# Altium footprint library Connector_PinHeader_2.00mm.PcbLib: 278 footprints (part 8 of 18)
Each footprint in its own frame and in the unit in brackets; x right, y up, seen from the top. Pads: shape width x height; smd on the part's side, far side on the other; paste and mask are expansions set on the pad; w line width, h text height; cw(c..) or ccw(c..) is an arc to the next point about the centre after c.
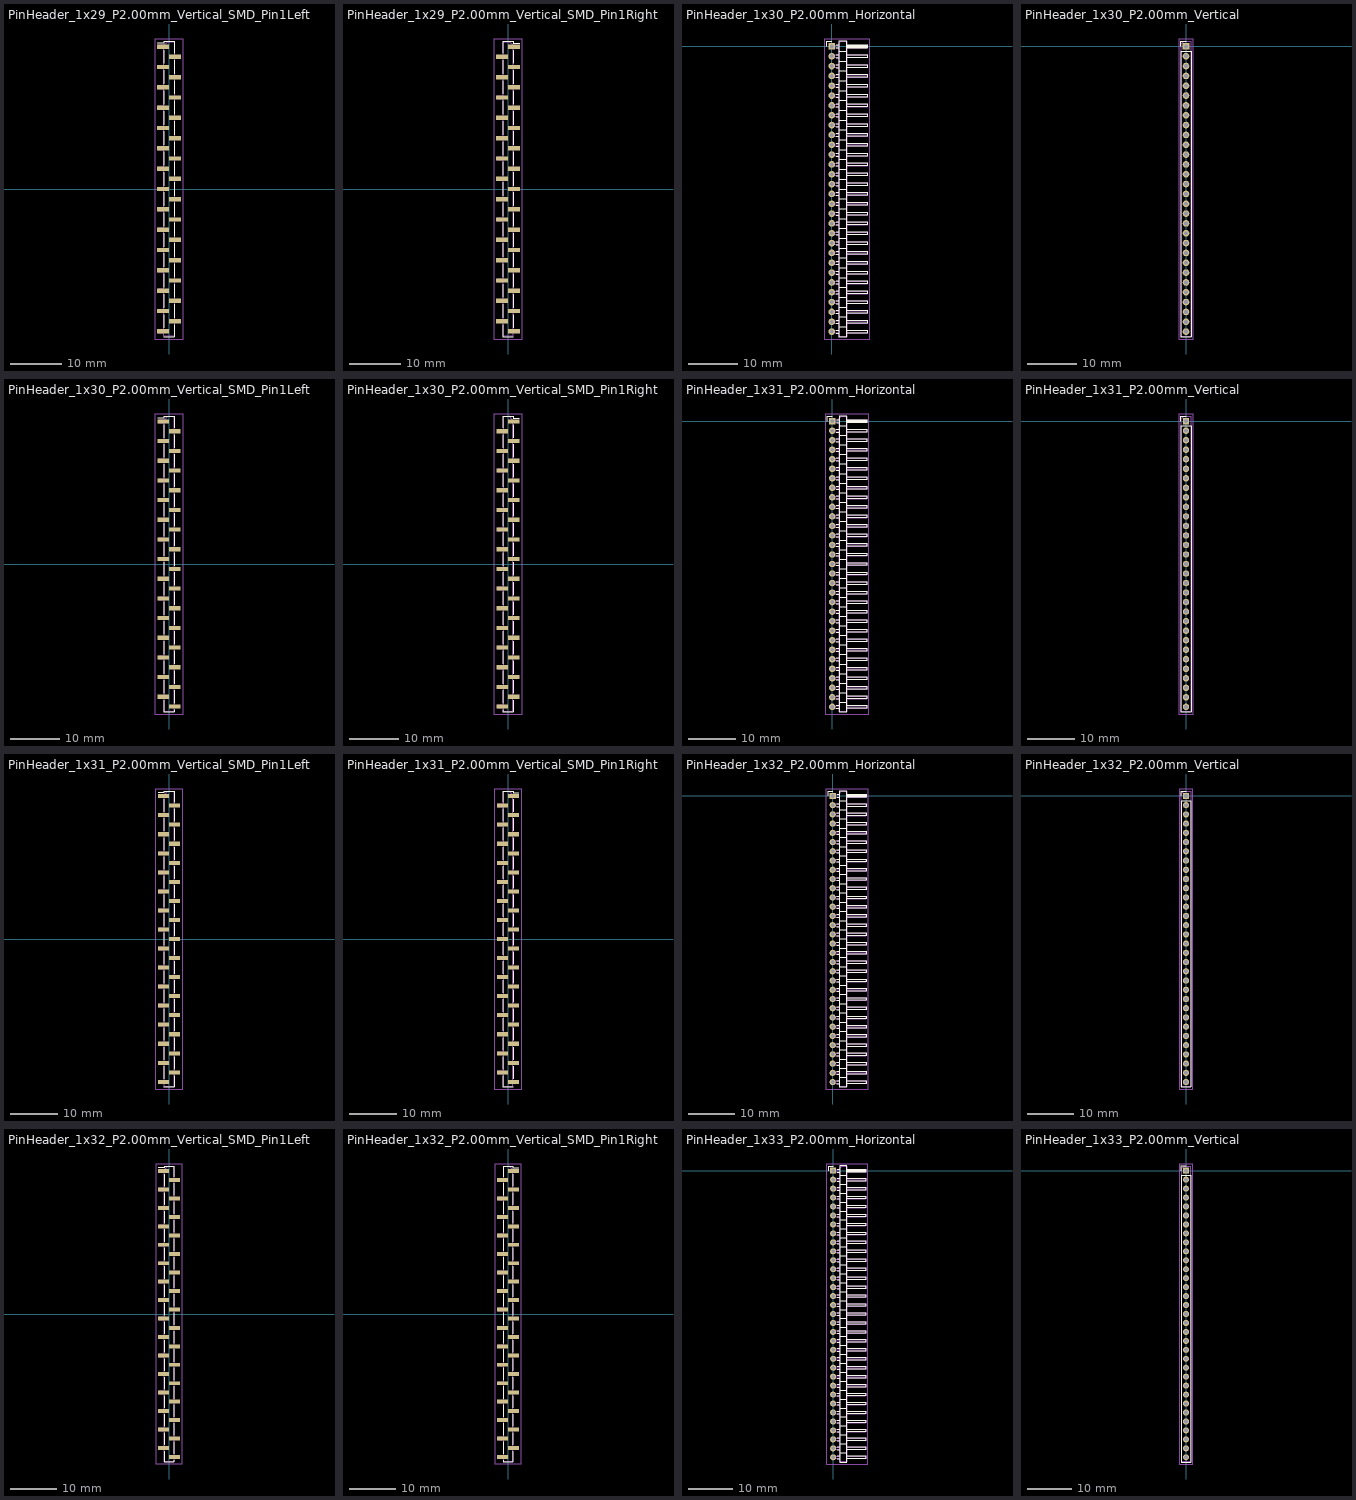
[diagram p7: the footprints below, top view; thin cyan lines are the x and y axes]

## PinHeader_1x29_P2.00mm_Vertical_SMD_Pin1Left [mm]
pads (29):
  rect 2.35x0.85 smd: 1(-1.175,28) 2(1.175,26) 3(-1.175,24) 4(1.175,22) 5(-1.175,20) 6(1.175,18) 7(-1.175,16) 8(1.175,14) 9(-1.175,12) 10(1.175,10) 11(-1.175,8) 12(1.175,6) 13(-1.175,4) 14(1.175,2) 15(-1.175,0) 16(1.175,-2) 17(-1.175,-4) 18(1.175,-6) 19(-1.175,-8) 20(1.175,-10) 21(-1.175,-12) 22(1.175,-14) 23(-1.175,-16) 24(1.175,-18) 25(-1.175,-20) 26(1.175,-22) 27(-1.175,-24) 28(1.175,-26) 29(-1.175,-28)
F.SilkS:
  lines w0.12: -2.29,28.685 -1.06,28.685 -1.06,29.06 1.06,29.06 1.06,26.685 ; -1.06,-29.06 1.06,-29.06 ; -1.06,-27.315 -1.06,-24.685 ; -1.06,-23.315 -1.06,-20.685 ; -1.06,-19.315 -1.06,-16.685 ; -1.06,-15.315 -1.06,-12.685 ; -1.06,-11.315 -1.06,-8.685 ; -1.06,-7.315 -1.06,-4.685 ; -1.06,-3.315 -1.06,-0.685 ; -1.06,0.685 -1.06,3.315 ; -1.06,4.685 -1.06,7.315 ; -1.06,8.685 -1.06,11.315 ; -1.06,12.685 -1.06,15.315 ; -1.06,16.685 -1.06,19.315 ; -1.06,20.685 -1.06,23.315 ; -1.06,24.685 -1.06,27.315 ; 1.06,-28.685 1.06,-29.06 ; 1.06,-26.685 1.06,-29.06 ; 1.06,-25.315 1.06,-22.685 ; 1.06,-21.315 1.06,-18.685 ; 1.06,-17.315 1.06,-14.685 ; 1.06,-13.315 1.06,-10.685 ; 1.06,-9.315 1.06,-6.685 ; 1.06,-5.315 1.06,-2.685 ; 1.06,-1.315 1.06,1.315 ; 1.06,2.685 1.06,5.315 ; 1.06,6.685 1.06,9.315 ; 1.06,10.685 1.06,13.315 ; 1.06,14.685 1.06,17.315 ; 1.06,18.685 1.06,21.315 ; 1.06,22.685 1.06,25.315
F.CrtYd:
  lines w0.05: -2.85,-29.5 2.85,-29.5 2.85,29.5 -2.85,29.5 -2.85,-29.5
F.Fab:
  lines w0.1: -1,-28.25 -2.1,-28.25 -2.1,-27.75 -1,-27.75 ; -1,-24.25 -2.1,-24.25 -2.1,-23.75 -1,-23.75 ; -1,-20.25 -2.1,-20.25 -2.1,-19.75 -1,-19.75 ; -1,-16.25 -2.1,-16.25 -2.1,-15.75 -1,-15.75 ; -1,-12.25 -2.1,-12.25 -2.1,-11.75 -1,-11.75 ; -1,-8.25 -2.1,-8.25 -2.1,-7.75 -1,-7.75 ; -1,-4.25 -2.1,-4.25 -2.1,-3.75 -1,-3.75 ; -1,-0.25 -2.1,-0.25 -2.1,0.25 -1,0.25 ; -1,3.75 -2.1,3.75 -2.1,4.25 -1,4.25 ; -1,7.75 -2.1,7.75 -2.1,8.25 -1,8.25 ; -1,11.75 -2.1,11.75 -2.1,12.25 -1,12.25 ; -1,15.75 -2.1,15.75 -2.1,16.25 -1,16.25 ; -1,19.75 -2.1,19.75 -2.1,20.25 -1,20.25 ; -1,23.75 -2.1,23.75 -2.1,24.25 -1,24.25 ; -1,27.75 -2.1,27.75 -2.1,28.25 -1,28.25 ; 1,-26.25 2.1,-26.25 2.1,-25.75 1,-25.75 ; 1,-22.25 2.1,-22.25 2.1,-21.75 1,-21.75 ; 1,-18.25 2.1,-18.25 2.1,-17.75 1,-17.75 ; 1,-14.25 2.1,-14.25 2.1,-13.75 1,-13.75 ; 1,-10.25 2.1,-10.25 2.1,-9.75 1,-9.75 ; 1,-6.25 2.1,-6.25 2.1,-5.75 1,-5.75 ; 1,-2.25 2.1,-2.25 2.1,-1.75 1,-1.75 ; 1,1.75 2.1,1.75 2.1,2.25 1,2.25 ; 1,5.75 2.1,5.75 2.1,6.25 1,6.25 ; 1,9.75 2.1,9.75 2.1,10.25 1,10.25 ; 1,13.75 2.1,13.75 2.1,14.25 1,14.25 ; 1,17.75 2.1,17.75 2.1,18.25 1,18.25 ; 1,21.75 2.1,21.75 2.1,22.25 1,22.25 ; 1,25.75 2.1,25.75 2.1,26.25 1,26.25 ; -1,28.25 -0.25,29 1,29 1,-29 -1,-29 -1,28.25
  text "'.Designator'" at 0.84,-4.047 h1

## PinHeader_1x29_P2.00mm_Vertical_SMD_Pin1Right [mm]
pads (29):
  rect 2.35x0.85 smd: 1(1.175,28) 2(-1.175,26) 3(1.175,24) 4(-1.175,22) 5(1.175,20) 6(-1.175,18) 7(1.175,16) 8(-1.175,14) 9(1.175,12) 10(-1.175,10) 11(1.175,8) 12(-1.175,6) 13(1.175,4) 14(-1.175,2) 15(1.175,0) 16(-1.175,-2) 17(1.175,-4) 18(-1.175,-6) 19(1.175,-8) 20(-1.175,-10) 21(1.175,-12) 22(-1.175,-14) 23(1.175,-16) 24(-1.175,-18) 25(1.175,-20) 26(-1.175,-22) 27(1.175,-24) 28(-1.175,-26) 29(1.175,-28)
F.SilkS:
  lines w0.12: -1.06,-28.685 -1.06,-29.06 ; -1.06,-26.685 -1.06,-29.06 ; -1.06,-25.315 -1.06,-22.685 ; -1.06,-21.315 -1.06,-18.685 ; -1.06,-17.315 -1.06,-14.685 ; -1.06,-13.315 -1.06,-10.685 ; -1.06,-9.315 -1.06,-6.685 ; -1.06,-5.315 -1.06,-2.685 ; -1.06,-1.315 -1.06,1.315 ; -1.06,2.685 -1.06,5.315 ; -1.06,6.685 -1.06,9.315 ; -1.06,10.685 -1.06,13.315 ; -1.06,14.685 -1.06,17.315 ; -1.06,18.685 -1.06,21.315 ; -1.06,22.685 -1.06,25.315 ; -1.06,26.685 -1.06,29.06 1.06,29.06 1.06,28.685 2.29,28.685 ; 1.06,-29.06 -1.06,-29.06 ; 1.06,-27.315 1.06,-24.685 ; 1.06,-23.315 1.06,-20.685 ; 1.06,-19.315 1.06,-16.685 ; 1.06,-15.315 1.06,-12.685 ; 1.06,-11.315 1.06,-8.685 ; 1.06,-7.315 1.06,-4.685 ; 1.06,-3.315 1.06,-0.685 ; 1.06,0.685 1.06,3.315 ; 1.06,4.685 1.06,7.315 ; 1.06,8.685 1.06,11.315 ; 1.06,12.685 1.06,15.315 ; 1.06,16.685 1.06,19.315 ; 1.06,20.685 1.06,23.315 ; 1.06,24.685 1.06,27.315
F.CrtYd:
  lines w0.05: -2.85,-29.5 -2.85,29.5 2.85,29.5 2.85,-29.5 -2.85,-29.5
F.Fab:
  lines w0.1: -1,-26.25 -2.1,-26.25 -2.1,-25.75 -1,-25.75 ; -1,-22.25 -2.1,-22.25 -2.1,-21.75 -1,-21.75 ; -1,-18.25 -2.1,-18.25 -2.1,-17.75 -1,-17.75 ; -1,-14.25 -2.1,-14.25 -2.1,-13.75 -1,-13.75 ; -1,-10.25 -2.1,-10.25 -2.1,-9.75 -1,-9.75 ; -1,-6.25 -2.1,-6.25 -2.1,-5.75 -1,-5.75 ; -1,-2.25 -2.1,-2.25 -2.1,-1.75 -1,-1.75 ; -1,1.75 -2.1,1.75 -2.1,2.25 -1,2.25 ; -1,5.75 -2.1,5.75 -2.1,6.25 -1,6.25 ; -1,9.75 -2.1,9.75 -2.1,10.25 -1,10.25 ; -1,13.75 -2.1,13.75 -2.1,14.25 -1,14.25 ; -1,17.75 -2.1,17.75 -2.1,18.25 -1,18.25 ; -1,21.75 -2.1,21.75 -2.1,22.25 -1,22.25 ; -1,25.75 -2.1,25.75 -2.1,26.25 -1,26.25 ; 1,-28.25 2.1,-28.25 2.1,-27.75 1,-27.75 ; 1,-24.25 2.1,-24.25 2.1,-23.75 1,-23.75 ; 1,-20.25 2.1,-20.25 2.1,-19.75 1,-19.75 ; 1,-16.25 2.1,-16.25 2.1,-15.75 1,-15.75 ; 1,-12.25 2.1,-12.25 2.1,-11.75 1,-11.75 ; 1,-8.25 2.1,-8.25 2.1,-7.75 1,-7.75 ; 1,-4.25 2.1,-4.25 2.1,-3.75 1,-3.75 ; 1,-0.25 2.1,-0.25 2.1,0.25 1,0.25 ; 1,3.75 2.1,3.75 2.1,4.25 1,4.25 ; 1,7.75 2.1,7.75 2.1,8.25 1,8.25 ; 1,11.75 2.1,11.75 2.1,12.25 1,12.25 ; 1,15.75 2.1,15.75 2.1,16.25 1,16.25 ; 1,19.75 2.1,19.75 2.1,20.25 1,20.25 ; 1,23.75 2.1,23.75 2.1,24.25 1,24.25 ; 1,27.75 2.1,27.75 2.1,28.25 1,28.25 ; 1,28.25 0.25,29 -1,29 -1,-29 1,-29 1,28.25
  text "'.Designator'" at 0.84,-4.047 h1

## PinHeader_1x30_P2.00mm_Horizontal [mm]
pads (30):
  rect 1.35x1.35 hole 0.8: 1(0,0)
  rrect100% 1.35x1.35 hole 0.8: 2(0,-2) 3(0,-4) 4(0,-6) 5(0,-8) 6(0,-10) 7(0,-12) 8(0,-14) 9(0,-16) 10(0,-18) 11(0,-20) 12(0,-22) 13(0,-24) 14(0,-26) 15(0,-28) 16(0,-30) 17(0,-32) 18(0,-34) 19(0,-36) 20(0,-38) 21(0,-40) 22(0,-42) 23(0,-44) 24(0,-46) 25(0,-48) 26(0,-50) 27(0,-52) 28(0,-54) 29(0,-56) 30(0,-58)
F.SilkS:
  drawing of 190 lines, arcs and shapes, not listed
F.CrtYd:
  lines w0.05: -1.5,-59.5 7.7,-59.5 7.7,1.5 -1.5,1.5 -1.5,-59.5
F.Fab:
  drawing of 185 lines, arcs and shapes, not listed
  text "'.Designator'" at 3.006,-32.642 h0.9

## PinHeader_1x30_P2.00mm_Vertical [mm]
pads (30):
  rect 1.35x1.35 hole 0.8: 1(0,0)
  rrect100% 1.35x1.35 hole 0.8: 2(0,-2) 3(0,-4) 4(0,-6) 5(0,-8) 6(0,-10) 7(0,-12) 8(0,-14) 9(0,-16) 10(0,-18) 11(0,-20) 12(0,-22) 13(0,-24) 14(0,-26) 15(0,-28) 16(0,-30) 17(0,-32) 18(0,-34) 19(0,-36) 20(0,-38) 21(0,-40) 22(0,-42) 23(0,-44) 24(0,-46) 25(0,-48) 26(0,-50) 27(0,-52) 28(0,-54) 29(0,-56) 30(0,-58)
F.SilkS:
  lines w0.12: -1.06,0 -1.06,1.06 0,1.06 ; -1.06,-59.06 1.06,-59.06 1.06,-1 -1.06,-1 -1.06,-59.06
F.CrtYd:
  lines w0.05: -1.5,-59.5 1.5,-59.5 1.5,1.5 -1.5,1.5 -1.5,-59.5
F.Fab:
  lines w0.1: -1,-59 1,-59 1,1 -0.5,1 -1,0.5 -1,-59
  text "'.Designator'" at 0.84,-33.047 h1

## PinHeader_1x30_P2.00mm_Vertical_SMD_Pin1Left [mm]
pads (30):
  rect 2.35x0.85 smd: 1(-1.175,29) 2(1.175,27) 3(-1.175,25) 4(1.175,23) 5(-1.175,21) 6(1.175,19) 7(-1.175,17) 8(1.175,15) 9(-1.175,13) 10(1.175,11) 11(-1.175,9) 12(1.175,7) 13(-1.175,5) 14(1.175,3) 15(-1.175,1) 16(1.175,-1) 17(-1.175,-3) 18(1.175,-5) 19(-1.175,-7) 20(1.175,-9) 21(-1.175,-11) 22(1.175,-13) 23(-1.175,-15) 24(1.175,-17) 25(-1.175,-19) 26(1.175,-21) 27(-1.175,-23) 28(1.175,-25) 29(-1.175,-27) 30(1.175,-29)
F.SilkS:
  lines w0.12: -2.29,29.685 -1.06,29.685 -1.06,30.06 1.06,30.06 1.06,27.685 ; -1.06,-27.685 -1.06,-30.06 1.06,-30.06 1.06,-29.685 ; -1.06,-26.315 -1.06,-23.685 ; -1.06,-22.315 -1.06,-19.685 ; -1.06,-18.315 -1.06,-15.685 ; -1.06,-14.315 -1.06,-11.685 ; -1.06,-10.315 -1.06,-7.685 ; -1.06,-6.315 -1.06,-3.685 ; -1.06,-2.315 -1.06,0.315 ; -1.06,1.685 -1.06,4.315 ; -1.06,5.685 -1.06,8.315 ; -1.06,9.685 -1.06,12.315 ; -1.06,13.685 -1.06,16.315 ; -1.06,17.685 -1.06,20.315 ; -1.06,21.685 -1.06,24.315 ; -1.06,25.685 -1.06,28.315 ; 1.06,-28.315 1.06,-25.685 ; 1.06,-24.315 1.06,-21.685 ; 1.06,-20.315 1.06,-17.685 ; 1.06,-16.315 1.06,-13.685 ; 1.06,-12.315 1.06,-9.685 ; 1.06,-8.315 1.06,-5.685 ; 1.06,-4.315 1.06,-1.685 ; 1.06,-0.315 1.06,2.315 ; 1.06,3.685 1.06,6.315 ; 1.06,7.685 1.06,10.315 ; 1.06,11.685 1.06,14.315 ; 1.06,15.685 1.06,18.315 ; 1.06,19.685 1.06,22.315 ; 1.06,23.685 1.06,26.315
F.CrtYd:
  lines w0.05: -2.85,-30.5 -2.85,30.5 2.85,30.5 2.85,-30.5 -2.85,-30.5
F.Fab:
  lines w0.1: -1,-27.25 -2.1,-27.25 -2.1,-26.75 -1,-26.75 ; -1,-23.25 -2.1,-23.25 -2.1,-22.75 -1,-22.75 ; -1,-19.25 -2.1,-19.25 -2.1,-18.75 -1,-18.75 ; -1,-15.25 -2.1,-15.25 -2.1,-14.75 -1,-14.75 ; -1,-11.25 -2.1,-11.25 -2.1,-10.75 -1,-10.75 ; -1,-7.25 -2.1,-7.25 -2.1,-6.75 -1,-6.75 ; -1,-3.25 -2.1,-3.25 -2.1,-2.75 -1,-2.75 ; -1,0.75 -2.1,0.75 -2.1,1.25 -1,1.25 ; -1,4.75 -2.1,4.75 -2.1,5.25 -1,5.25 ; -1,8.75 -2.1,8.75 -2.1,9.25 -1,9.25 ; -1,12.75 -2.1,12.75 -2.1,13.25 -1,13.25 ; -1,16.75 -2.1,16.75 -2.1,17.25 -1,17.25 ; -1,20.75 -2.1,20.75 -2.1,21.25 -1,21.25 ; -1,24.75 -2.1,24.75 -2.1,25.25 -1,25.25 ; -1,28.75 -2.1,28.75 -2.1,29.25 -1,29.25 ; 1,-29.25 2.1,-29.25 2.1,-28.75 1,-28.75 ; 1,-25.25 2.1,-25.25 2.1,-24.75 1,-24.75 ; 1,-21.25 2.1,-21.25 2.1,-20.75 1,-20.75 ; 1,-17.25 2.1,-17.25 2.1,-16.75 1,-16.75 ; 1,-13.25 2.1,-13.25 2.1,-12.75 1,-12.75 ; 1,-9.25 2.1,-9.25 2.1,-8.75 1,-8.75 ; 1,-5.25 2.1,-5.25 2.1,-4.75 1,-4.75 ; 1,-1.25 2.1,-1.25 2.1,-0.75 1,-0.75 ; 1,2.75 2.1,2.75 2.1,3.25 1,3.25 ; 1,6.75 2.1,6.75 2.1,7.25 1,7.25 ; 1,10.75 2.1,10.75 2.1,11.25 1,11.25 ; 1,14.75 2.1,14.75 2.1,15.25 1,15.25 ; 1,18.75 2.1,18.75 2.1,19.25 1,19.25 ; 1,22.75 2.1,22.75 2.1,23.25 1,23.25 ; 1,26.75 2.1,26.75 2.1,27.25 1,27.25 ; -1,29.25 -0.25,30 1,30 1,-30 -1,-30 -1,29.25
  text "'.Designator'" at 0.84,-4.047 h1

## PinHeader_1x30_P2.00mm_Vertical_SMD_Pin1Right [mm]
pads (30):
  rect 2.35x0.85 smd: 1(1.175,29) 2(-1.175,27) 3(1.175,25) 4(-1.175,23) 5(1.175,21) 6(-1.175,19) 7(1.175,17) 8(-1.175,15) 9(1.175,13) 10(-1.175,11) 11(1.175,9) 12(-1.175,7) 13(1.175,5) 14(-1.175,3) 15(1.175,1) 16(-1.175,-1) 17(1.175,-3) 18(-1.175,-5) 19(1.175,-7) 20(-1.175,-9) 21(1.175,-11) 22(-1.175,-13) 23(1.175,-15) 24(-1.175,-17) 25(1.175,-19) 26(-1.175,-21) 27(1.175,-23) 28(-1.175,-25) 29(1.175,-27) 30(-1.175,-29)
F.SilkS:
  lines w0.12: -1.06,-29.685 -1.06,-30.06 1.06,-30.06 1.06,-27.685 ; -1.06,-28.315 -1.06,-25.685 ; -1.06,-24.315 -1.06,-21.685 ; -1.06,-20.315 -1.06,-17.685 ; -1.06,-16.315 -1.06,-13.685 ; -1.06,-12.315 -1.06,-9.685 ; -1.06,-8.315 -1.06,-5.685 ; -1.06,-4.315 -1.06,-1.685 ; -1.06,-0.315 -1.06,2.315 ; -1.06,3.685 -1.06,6.315 ; -1.06,7.685 -1.06,10.315 ; -1.06,11.685 -1.06,14.315 ; -1.06,15.685 -1.06,18.315 ; -1.06,19.685 -1.06,22.315 ; -1.06,23.685 -1.06,26.315 ; -1.06,27.685 -1.06,30.06 1.06,30.06 1.06,29.685 2.29,29.685 ; 1.06,-26.315 1.06,-23.685 ; 1.06,-22.315 1.06,-19.685 ; 1.06,-18.315 1.06,-15.685 ; 1.06,-14.315 1.06,-11.685 ; 1.06,-10.315 1.06,-7.685 ; 1.06,-6.315 1.06,-3.685 ; 1.06,-2.315 1.06,0.315 ; 1.06,1.685 1.06,4.315 ; 1.06,5.685 1.06,8.315 ; 1.06,9.685 1.06,12.315 ; 1.06,13.685 1.06,16.315 ; 1.06,17.685 1.06,20.315 ; 1.06,21.685 1.06,24.315 ; 1.06,25.685 1.06,28.315
F.CrtYd:
  lines w0.05: -2.85,-30.5 -2.85,30.5 2.85,30.5 2.85,-30.5 -2.85,-30.5
F.Fab:
  lines w0.1: -1,-29.25 -2.1,-29.25 -2.1,-28.75 -1,-28.75 ; -1,-25.25 -2.1,-25.25 -2.1,-24.75 -1,-24.75 ; -1,-21.25 -2.1,-21.25 -2.1,-20.75 -1,-20.75 ; -1,-17.25 -2.1,-17.25 -2.1,-16.75 -1,-16.75 ; -1,-13.25 -2.1,-13.25 -2.1,-12.75 -1,-12.75 ; -1,-9.25 -2.1,-9.25 -2.1,-8.75 -1,-8.75 ; -1,-5.25 -2.1,-5.25 -2.1,-4.75 -1,-4.75 ; -1,-1.25 -2.1,-1.25 -2.1,-0.75 -1,-0.75 ; -1,2.75 -2.1,2.75 -2.1,3.25 -1,3.25 ; -1,6.75 -2.1,6.75 -2.1,7.25 -1,7.25 ; -1,10.75 -2.1,10.75 -2.1,11.25 -1,11.25 ; -1,14.75 -2.1,14.75 -2.1,15.25 -1,15.25 ; -1,18.75 -2.1,18.75 -2.1,19.25 -1,19.25 ; -1,22.75 -2.1,22.75 -2.1,23.25 -1,23.25 ; -1,26.75 -2.1,26.75 -2.1,27.25 -1,27.25 ; 1,-27.25 2.1,-27.25 2.1,-26.75 1,-26.75 ; 1,-23.25 2.1,-23.25 2.1,-22.75 1,-22.75 ; 1,-19.25 2.1,-19.25 2.1,-18.75 1,-18.75 ; 1,-15.25 2.1,-15.25 2.1,-14.75 1,-14.75 ; 1,-11.25 2.1,-11.25 2.1,-10.75 1,-10.75 ; 1,-7.25 2.1,-7.25 2.1,-6.75 1,-6.75 ; 1,-3.25 2.1,-3.25 2.1,-2.75 1,-2.75 ; 1,0.75 2.1,0.75 2.1,1.25 1,1.25 ; 1,4.75 2.1,4.75 2.1,5.25 1,5.25 ; 1,8.75 2.1,8.75 2.1,9.25 1,9.25 ; 1,12.75 2.1,12.75 2.1,13.25 1,13.25 ; 1,16.75 2.1,16.75 2.1,17.25 1,17.25 ; 1,20.75 2.1,20.75 2.1,21.25 1,21.25 ; 1,24.75 2.1,24.75 2.1,25.25 1,25.25 ; 1,28.75 2.1,28.75 2.1,29.25 1,29.25 ; 1,29.25 1,-30 -1,-30 -1,30 0.25,30 1,29.25
  text "'.Designator'" at 0.84,-4.047 h1

## PinHeader_1x31_P2.00mm_Horizontal [mm]
pads (31):
  rect 1.35x1.35 hole 0.8: 1(0,0)
  rrect100% 1.35x1.35 hole 0.8: 2(0,-2) 3(0,-4) 4(0,-6) 5(0,-8) 6(0,-10) 7(0,-12) 8(0,-14) 9(0,-16) 10(0,-18) 11(0,-20) 12(0,-22) 13(0,-24) 14(0,-26) 15(0,-28) 16(0,-30) 17(0,-32) 18(0,-34) 19(0,-36) 20(0,-38) 21(0,-40) 22(0,-42) 23(0,-44) 24(0,-46) 25(0,-48) 26(0,-50) 27(0,-52) 28(0,-54) 29(0,-56) 30(0,-58) 31(0,-60)
F.SilkS:
  drawing of 196 lines, arcs and shapes, not listed
F.CrtYd:
  lines w0.05: -1.5,-61.5 -1.5,1.5 7.7,1.5 7.7,-61.5 -1.5,-61.5
F.Fab:
  drawing of 191 lines, arcs and shapes, not listed
  text "'.Designator'" at 3.006,-33.642 h0.9

## PinHeader_1x31_P2.00mm_Vertical [mm]
pads (31):
  rect 1.35x1.35 hole 0.8: 1(0,0)
  rrect100% 1.35x1.35 hole 0.8: 2(0,-2) 3(0,-4) 4(0,-6) 5(0,-8) 6(0,-10) 7(0,-12) 8(0,-14) 9(0,-16) 10(0,-18) 11(0,-20) 12(0,-22) 13(0,-24) 14(0,-26) 15(0,-28) 16(0,-30) 17(0,-32) 18(0,-34) 19(0,-36) 20(0,-38) 21(0,-40) 22(0,-42) 23(0,-44) 24(0,-46) 25(0,-48) 26(0,-50) 27(0,-52) 28(0,-54) 29(0,-56) 30(0,-58) 31(0,-60)
F.SilkS:
  lines w0.12: -1.06,0 -1.06,1.06 0,1.06 ; -1.06,-61.06 -1.06,-1 1.06,-1 1.06,-61.06 -1.06,-61.06
F.CrtYd:
  lines w0.05: -1.5,-61.5 1.5,-61.5 1.5,1.5 -1.5,1.5 -1.5,-61.5
F.Fab:
  lines w0.1: -1,-61 -1,0.5 -0.5,1 1,1 1,-61 -1,-61
  text "'.Designator'" at 0.84,-34.047 h1

## PinHeader_1x31_P2.00mm_Vertical_SMD_Pin1Left [mm]
pads (31):
  rect 2.35x0.85 smd: 1(-1.175,30) 2(1.175,28) 3(-1.175,26) 4(1.175,24) 5(-1.175,22) 6(1.175,20) 7(-1.175,18) 8(1.175,16) 9(-1.175,14) 10(1.175,12) 11(-1.175,10) 12(1.175,8) 13(-1.175,6) 14(1.175,4) 15(-1.175,2) 16(1.175,0) 17(-1.175,-2) 18(1.175,-4) 19(-1.175,-6) 20(1.175,-8) 21(-1.175,-10) 22(1.175,-12) 23(-1.175,-14) 24(1.175,-16) 25(-1.175,-18) 26(1.175,-20) 27(-1.175,-22) 28(1.175,-24) 29(-1.175,-26) 30(1.175,-28) 31(-1.175,-30)
F.SilkS:
  lines w0.12: -2.29,30.685 -1.06,30.685 -1.06,31.06 1.06,31.06 1.06,28.685 ; -1.06,-31.06 1.06,-31.06 ; -1.06,-29.315 -1.06,-26.685 ; -1.06,-25.315 -1.06,-22.685 ; -1.06,-21.315 -1.06,-18.685 ; -1.06,-17.315 -1.06,-14.685 ; -1.06,-13.315 -1.06,-10.685 ; -1.06,-9.315 -1.06,-6.685 ; -1.06,-5.315 -1.06,-2.685 ; -1.06,-1.315 -1.06,1.315 ; -1.06,2.685 -1.06,5.315 ; -1.06,6.685 -1.06,9.315 ; -1.06,10.685 -1.06,13.315 ; -1.06,14.685 -1.06,17.315 ; -1.06,18.685 -1.06,21.315 ; -1.06,22.685 -1.06,25.315 ; -1.06,26.685 -1.06,29.315 ; 1.06,-30.685 1.06,-31.06 ; 1.06,-28.685 1.06,-31.06 ; 1.06,-27.315 1.06,-24.685 ; 1.06,-23.315 1.06,-20.685 ; 1.06,-19.315 1.06,-16.685 ; 1.06,-15.315 1.06,-12.685 ; 1.06,-11.315 1.06,-8.685 ; 1.06,-7.315 1.06,-4.685 ; 1.06,-3.315 1.06,-0.685 ; 1.06,0.685 1.06,3.315 ; 1.06,4.685 1.06,7.315 ; 1.06,8.685 1.06,11.315 ; 1.06,12.685 1.06,15.315 ; 1.06,16.685 1.06,19.315 ; 1.06,20.685 1.06,23.315 ; 1.06,24.685 1.06,27.315
F.CrtYd:
  lines w0.05: -2.85,-31.5 -2.85,31.5 2.85,31.5 2.85,-31.5 -2.85,-31.5
F.Fab:
  lines w0.1: -1,-30.25 -2.1,-30.25 -2.1,-29.75 -1,-29.75 ; -1,-26.25 -2.1,-26.25 -2.1,-25.75 -1,-25.75 ; -1,-22.25 -2.1,-22.25 -2.1,-21.75 -1,-21.75 ; -1,-18.25 -2.1,-18.25 -2.1,-17.75 -1,-17.75 ; -1,-14.25 -2.1,-14.25 -2.1,-13.75 -1,-13.75 ; -1,-10.25 -2.1,-10.25 -2.1,-9.75 -1,-9.75 ; -1,-6.25 -2.1,-6.25 -2.1,-5.75 -1,-5.75 ; -1,-2.25 -2.1,-2.25 -2.1,-1.75 -1,-1.75 ; -1,1.75 -2.1,1.75 -2.1,2.25 -1,2.25 ; -1,5.75 -2.1,5.75 -2.1,6.25 -1,6.25 ; -1,9.75 -2.1,9.75 -2.1,10.25 -1,10.25 ; -1,13.75 -2.1,13.75 -2.1,14.25 -1,14.25 ; -1,17.75 -2.1,17.75 -2.1,18.25 -1,18.25 ; -1,21.75 -2.1,21.75 -2.1,22.25 -1,22.25 ; -1,25.75 -2.1,25.75 -2.1,26.25 -1,26.25 ; -1,29.75 -2.1,29.75 -2.1,30.25 -1,30.25 ; 1,-28.25 2.1,-28.25 2.1,-27.75 1,-27.75 ; 1,-24.25 2.1,-24.25 2.1,-23.75 1,-23.75 ; 1,-20.25 2.1,-20.25 2.1,-19.75 1,-19.75 ; 1,-16.25 2.1,-16.25 2.1,-15.75 1,-15.75 ; 1,-12.25 2.1,-12.25 2.1,-11.75 1,-11.75 ; 1,-8.25 2.1,-8.25 2.1,-7.75 1,-7.75 ; 1,-4.25 2.1,-4.25 2.1,-3.75 1,-3.75 ; 1,-0.25 2.1,-0.25 2.1,0.25 1,0.25 ; 1,3.75 2.1,3.75 2.1,4.25 1,4.25 ; 1,7.75 2.1,7.75 2.1,8.25 1,8.25 ; 1,11.75 2.1,11.75 2.1,12.25 1,12.25 ; 1,15.75 2.1,15.75 2.1,16.25 1,16.25 ; 1,19.75 2.1,19.75 2.1,20.25 1,20.25 ; 1,23.75 2.1,23.75 2.1,24.25 1,24.25 ; 1,27.75 2.1,27.75 2.1,28.25 1,28.25 ; -1,30.25 -0.25,31 1,31 1,-31 -1,-31 -1,30.25
  text "'.Designator'" at 0.84,-4.047 h1

## PinHeader_1x31_P2.00mm_Vertical_SMD_Pin1Right [mm]
pads (31):
  rect 2.35x0.85 smd: 1(1.175,30) 2(-1.175,28) 3(1.175,26) 4(-1.175,24) 5(1.175,22) 6(-1.175,20) 7(1.175,18) 8(-1.175,16) 9(1.175,14) 10(-1.175,12) 11(1.175,10) 12(-1.175,8) 13(1.175,6) 14(-1.175,4) 15(1.175,2) 16(-1.175,0) 17(1.175,-2) 18(-1.175,-4) 19(1.175,-6) 20(-1.175,-8) 21(1.175,-10) 22(-1.175,-12) 23(1.175,-14) 24(-1.175,-16) 25(1.175,-18) 26(-1.175,-20) 27(1.175,-22) 28(-1.175,-24) 29(1.175,-26) 30(-1.175,-28) 31(1.175,-30)
F.SilkS:
  lines w0.12: -1.06,-30.685 -1.06,-31.06 ; -1.06,-28.685 -1.06,-31.06 ; -1.06,-27.315 -1.06,-24.685 ; -1.06,-23.315 -1.06,-20.685 ; -1.06,-19.315 -1.06,-16.685 ; -1.06,-15.315 -1.06,-12.685 ; -1.06,-11.315 -1.06,-8.685 ; -1.06,-7.315 -1.06,-4.685 ; -1.06,-3.315 -1.06,-0.685 ; -1.06,0.685 -1.06,3.315 ; -1.06,4.685 -1.06,7.315 ; -1.06,8.685 -1.06,11.315 ; -1.06,12.685 -1.06,15.315 ; -1.06,16.685 -1.06,19.315 ; -1.06,20.685 -1.06,23.315 ; -1.06,24.685 -1.06,27.315 ; -1.06,28.685 -1.06,31.06 1.06,31.06 1.06,30.685 2.29,30.685 ; 1.06,-31.06 -1.06,-31.06 ; 1.06,-29.315 1.06,-26.685 ; 1.06,-25.315 1.06,-22.685 ; 1.06,-21.315 1.06,-18.685 ; 1.06,-17.315 1.06,-14.685 ; 1.06,-13.315 1.06,-10.685 ; 1.06,-9.315 1.06,-6.685 ; 1.06,-5.315 1.06,-2.685 ; 1.06,-1.315 1.06,1.315 ; 1.06,2.685 1.06,5.315 ; 1.06,6.685 1.06,9.315 ; 1.06,10.685 1.06,13.315 ; 1.06,14.685 1.06,17.315 ; 1.06,18.685 1.06,21.315 ; 1.06,22.685 1.06,25.315 ; 1.06,26.685 1.06,29.315
F.CrtYd:
  lines w0.05: -2.85,-31.5 2.85,-31.5 2.85,31.5 -2.85,31.5 -2.85,-31.5
F.Fab:
  lines w0.1: -1,-28.25 -2.1,-28.25 -2.1,-27.75 -1,-27.75 ; -1,-24.25 -2.1,-24.25 -2.1,-23.75 -1,-23.75 ; -1,-20.25 -2.1,-20.25 -2.1,-19.75 -1,-19.75 ; -1,-16.25 -2.1,-16.25 -2.1,-15.75 -1,-15.75 ; -1,-12.25 -2.1,-12.25 -2.1,-11.75 -1,-11.75 ; -1,-8.25 -2.1,-8.25 -2.1,-7.75 -1,-7.75 ; -1,-4.25 -2.1,-4.25 -2.1,-3.75 -1,-3.75 ; -1,-0.25 -2.1,-0.25 -2.1,0.25 -1,0.25 ; -1,3.75 -2.1,3.75 -2.1,4.25 -1,4.25 ; -1,7.75 -2.1,7.75 -2.1,8.25 -1,8.25 ; -1,11.75 -2.1,11.75 -2.1,12.25 -1,12.25 ; -1,15.75 -2.1,15.75 -2.1,16.25 -1,16.25 ; -1,19.75 -2.1,19.75 -2.1,20.25 -1,20.25 ; -1,23.75 -2.1,23.75 -2.1,24.25 -1,24.25 ; -1,27.75 -2.1,27.75 -2.1,28.25 -1,28.25 ; 1,-30.25 2.1,-30.25 2.1,-29.75 1,-29.75 ; 1,-26.25 2.1,-26.25 2.1,-25.75 1,-25.75 ; 1,-22.25 2.1,-22.25 2.1,-21.75 1,-21.75 ; 1,-18.25 2.1,-18.25 2.1,-17.75 1,-17.75 ; 1,-14.25 2.1,-14.25 2.1,-13.75 1,-13.75 ; 1,-10.25 2.1,-10.25 2.1,-9.75 1,-9.75 ; 1,-6.25 2.1,-6.25 2.1,-5.75 1,-5.75 ; 1,-2.25 2.1,-2.25 2.1,-1.75 1,-1.75 ; 1,1.75 2.1,1.75 2.1,2.25 1,2.25 ; 1,5.75 2.1,5.75 2.1,6.25 1,6.25 ; 1,9.75 2.1,9.75 2.1,10.25 1,10.25 ; 1,13.75 2.1,13.75 2.1,14.25 1,14.25 ; 1,17.75 2.1,17.75 2.1,18.25 1,18.25 ; 1,21.75 2.1,21.75 2.1,22.25 1,22.25 ; 1,25.75 2.1,25.75 2.1,26.25 1,26.25 ; 1,29.75 2.1,29.75 2.1,30.25 1,30.25 ; 1,30.25 1,-31 -1,-31 -1,31 0.25,31 1,30.25
  text "'.Designator'" at 0.84,-4.047 h1

## PinHeader_1x32_P2.00mm_Horizontal [mm]
pads (32):
  rect 1.35x1.35 hole 0.8: 1(0,0)
  rrect100% 1.35x1.35 hole 0.8: 2(0,-2) 3(0,-4) 4(0,-6) 5(0,-8) 6(0,-10) 7(0,-12) 8(0,-14) 9(0,-16) 10(0,-18) 11(0,-20) 12(0,-22) 13(0,-24) 14(0,-26) 15(0,-28) 16(0,-30) 17(0,-32) 18(0,-34) 19(0,-36) 20(0,-38) 21(0,-40) 22(0,-42) 23(0,-44) 24(0,-46) 25(0,-48) 26(0,-50) 27(0,-52) 28(0,-54) 29(0,-56) 30(0,-58) 31(0,-60) 32(0,-62)
F.SilkS:
  drawing of 202 lines, arcs and shapes, not listed
F.CrtYd:
  lines w0.05: -1.5,-63.5 7.7,-63.5 7.7,1.5 -1.5,1.5 -1.5,-63.5
F.Fab:
  drawing of 197 lines, arcs and shapes, not listed
  text "'.Designator'" at 3.006,-34.642 h0.9

## PinHeader_1x32_P2.00mm_Vertical [mm]
pads (32):
  rect 1.35x1.35 hole 0.8: 1(0,0)
  rrect100% 1.35x1.35 hole 0.8: 2(0,-2) 3(0,-4) 4(0,-6) 5(0,-8) 6(0,-10) 7(0,-12) 8(0,-14) 9(0,-16) 10(0,-18) 11(0,-20) 12(0,-22) 13(0,-24) 14(0,-26) 15(0,-28) 16(0,-30) 17(0,-32) 18(0,-34) 19(0,-36) 20(0,-38) 21(0,-40) 22(0,-42) 23(0,-44) 24(0,-46) 25(0,-48) 26(0,-50) 27(0,-52) 28(0,-54) 29(0,-56) 30(0,-58) 31(0,-60) 32(0,-62)
F.SilkS:
  lines w0.12: -1.06,0 -1.06,1.06 0,1.06 ; -1.06,-63.06 1.06,-63.06 1.06,-1 -1.06,-1 -1.06,-63.06
F.CrtYd:
  lines w0.05: -1.5,-63.5 1.5,-63.5 1.5,1.5 -1.5,1.5 -1.5,-63.5
F.Fab:
  lines w0.1: -1,-63 -1,0.5 -0.5,1 1,1 1,-63 -1,-63
  text "'.Designator'" at 0.84,-35.047 h1

## PinHeader_1x32_P2.00mm_Vertical_SMD_Pin1Left [mm]
pads (32):
  rect 2.35x0.85 smd: 1(-1.175,31) 2(1.175,29) 3(-1.175,27) 4(1.175,25) 5(-1.175,23) 6(1.175,21) 7(-1.175,19) 8(1.175,17) 9(-1.175,15) 10(1.175,13) 11(-1.175,11) 12(1.175,9) 13(-1.175,7) 14(1.175,5) 15(-1.175,3) 16(1.175,1) 17(-1.175,-1) 18(1.175,-3) 19(-1.175,-5) 20(1.175,-7) 21(-1.175,-9) 22(1.175,-11) 23(-1.175,-13) 24(1.175,-15) 25(-1.175,-17) 26(1.175,-19) 27(-1.175,-21) 28(1.175,-23) 29(-1.175,-25) 30(1.175,-27) 31(-1.175,-29) 32(1.175,-31)
F.SilkS:
  lines w0.12: -2.29,31.685 -1.06,31.685 -1.06,32.06 1.06,32.06 1.06,29.685 ; -1.06,-29.685 -1.06,-32.06 1.06,-32.06 1.06,-31.685 ; -1.06,-28.315 -1.06,-25.685 ; -1.06,-24.315 -1.06,-21.685 ; -1.06,-20.315 -1.06,-17.685 ; -1.06,-16.315 -1.06,-13.685 ; -1.06,-12.315 -1.06,-9.685 ; -1.06,-8.315 -1.06,-5.685 ; -1.06,-4.315 -1.06,-1.685 ; -1.06,-0.315 -1.06,2.315 ; -1.06,3.685 -1.06,6.315 ; -1.06,7.685 -1.06,10.315 ; -1.06,11.685 -1.06,14.315 ; -1.06,15.685 -1.06,18.315 ; -1.06,19.685 -1.06,22.315 ; -1.06,23.685 -1.06,26.315 ; -1.06,27.685 -1.06,30.315 ; 1.06,-30.315 1.06,-27.685 ; 1.06,-26.315 1.06,-23.685 ; 1.06,-22.315 1.06,-19.685 ; 1.06,-18.315 1.06,-15.685 ; 1.06,-14.315 1.06,-11.685 ; 1.06,-10.315 1.06,-7.685 ; 1.06,-6.315 1.06,-3.685 ; 1.06,-2.315 1.06,0.315 ; 1.06,1.685 1.06,4.315 ; 1.06,5.685 1.06,8.315 ; 1.06,9.685 1.06,12.315 ; 1.06,13.685 1.06,16.315 ; 1.06,17.685 1.06,20.315 ; 1.06,21.685 1.06,24.315 ; 1.06,25.685 1.06,28.315
F.CrtYd:
  lines w0.05: -2.85,-32.5 -2.85,32.5 2.85,32.5 2.85,-32.5 -2.85,-32.5
F.Fab:
  lines w0.1: -1,-29.25 -2.1,-29.25 -2.1,-28.75 -1,-28.75 ; -1,-25.25 -2.1,-25.25 -2.1,-24.75 -1,-24.75 ; -1,-21.25 -2.1,-21.25 -2.1,-20.75 -1,-20.75 ; -1,-17.25 -2.1,-17.25 -2.1,-16.75 -1,-16.75 ; -1,-13.25 -2.1,-13.25 -2.1,-12.75 -1,-12.75 ; -1,-9.25 -2.1,-9.25 -2.1,-8.75 -1,-8.75 ; -1,-5.25 -2.1,-5.25 -2.1,-4.75 -1,-4.75 ; -1,-1.25 -2.1,-1.25 -2.1,-0.75 -1,-0.75 ; -1,2.75 -2.1,2.75 -2.1,3.25 -1,3.25 ; -1,6.75 -2.1,6.75 -2.1,7.25 -1,7.25 ; -1,10.75 -2.1,10.75 -2.1,11.25 -1,11.25 ; -1,14.75 -2.1,14.75 -2.1,15.25 -1,15.25 ; -1,18.75 -2.1,18.75 -2.1,19.25 -1,19.25 ; -1,22.75 -2.1,22.75 -2.1,23.25 -1,23.25 ; -1,26.75 -2.1,26.75 -2.1,27.25 -1,27.25 ; -1,30.75 -2.1,30.75 -2.1,31.25 -1,31.25 ; 1,-31.25 2.1,-31.25 2.1,-30.75 1,-30.75 ; 1,-27.25 2.1,-27.25 2.1,-26.75 1,-26.75 ; 1,-23.25 2.1,-23.25 2.1,-22.75 1,-22.75 ; 1,-19.25 2.1,-19.25 2.1,-18.75 1,-18.75 ; 1,-15.25 2.1,-15.25 2.1,-14.75 1,-14.75 ; 1,-11.25 2.1,-11.25 2.1,-10.75 1,-10.75 ; 1,-7.25 2.1,-7.25 2.1,-6.75 1,-6.75 ; 1,-3.25 2.1,-3.25 2.1,-2.75 1,-2.75 ; 1,0.75 2.1,0.75 2.1,1.25 1,1.25 ; 1,4.75 2.1,4.75 2.1,5.25 1,5.25 ; 1,8.75 2.1,8.75 2.1,9.25 1,9.25 ; 1,12.75 2.1,12.75 2.1,13.25 1,13.25 ; 1,16.75 2.1,16.75 2.1,17.25 1,17.25 ; 1,20.75 2.1,20.75 2.1,21.25 1,21.25 ; 1,24.75 2.1,24.75 2.1,25.25 1,25.25 ; 1,28.75 2.1,28.75 2.1,29.25 1,29.25 ; -1,31.25 -1,-32 1,-32 1,32 -0.25,32 -1,31.25
  text "'.Designator'" at 0.84,-4.047 h1

## PinHeader_1x32_P2.00mm_Vertical_SMD_Pin1Right [mm]
pads (32):
  rect 2.35x0.85 smd: 1(1.175,31) 2(-1.175,29) 3(1.175,27) 4(-1.175,25) 5(1.175,23) 6(-1.175,21) 7(1.175,19) 8(-1.175,17) 9(1.175,15) 10(-1.175,13) 11(1.175,11) 12(-1.175,9) 13(1.175,7) 14(-1.175,5) 15(1.175,3) 16(-1.175,1) 17(1.175,-1) 18(-1.175,-3) 19(1.175,-5) 20(-1.175,-7) 21(1.175,-9) 22(-1.175,-11) 23(1.175,-13) 24(-1.175,-15) 25(1.175,-17) 26(-1.175,-19) 27(1.175,-21) 28(-1.175,-23) 29(1.175,-25) 30(-1.175,-27) 31(1.175,-29) 32(-1.175,-31)
F.SilkS:
  lines w0.12: -1.06,-31.685 -1.06,-32.06 1.06,-32.06 1.06,-29.685 ; -1.06,-30.315 -1.06,-27.685 ; -1.06,-26.315 -1.06,-23.685 ; -1.06,-22.315 -1.06,-19.685 ; -1.06,-18.315 -1.06,-15.685 ; -1.06,-14.315 -1.06,-11.685 ; -1.06,-10.315 -1.06,-7.685 ; -1.06,-6.315 -1.06,-3.685 ; -1.06,-2.315 -1.06,0.315 ; -1.06,1.685 -1.06,4.315 ; -1.06,5.685 -1.06,8.315 ; -1.06,9.685 -1.06,12.315 ; -1.06,13.685 -1.06,16.315 ; -1.06,17.685 -1.06,20.315 ; -1.06,21.685 -1.06,24.315 ; -1.06,25.685 -1.06,28.315 ; -1.06,29.685 -1.06,32.06 1.06,32.06 1.06,31.685 2.29,31.685 ; 1.06,-28.315 1.06,-25.685 ; 1.06,-24.315 1.06,-21.685 ; 1.06,-20.315 1.06,-17.685 ; 1.06,-16.315 1.06,-13.685 ; 1.06,-12.315 1.06,-9.685 ; 1.06,-8.315 1.06,-5.685 ; 1.06,-4.315 1.06,-1.685 ; 1.06,-0.315 1.06,2.315 ; 1.06,3.685 1.06,6.315 ; 1.06,7.685 1.06,10.315 ; 1.06,11.685 1.06,14.315 ; 1.06,15.685 1.06,18.315 ; 1.06,19.685 1.06,22.315 ; 1.06,23.685 1.06,26.315 ; 1.06,27.685 1.06,30.315
F.CrtYd:
  lines w0.05: -2.85,-32.5 -2.85,32.5 2.85,32.5 2.85,-32.5 -2.85,-32.5
F.Fab:
  lines w0.1: -1,-31.25 -2.1,-31.25 -2.1,-30.75 -1,-30.75 ; -1,-27.25 -2.1,-27.25 -2.1,-26.75 -1,-26.75 ; -1,-23.25 -2.1,-23.25 -2.1,-22.75 -1,-22.75 ; -1,-19.25 -2.1,-19.25 -2.1,-18.75 -1,-18.75 ; -1,-15.25 -2.1,-15.25 -2.1,-14.75 -1,-14.75 ; -1,-11.25 -2.1,-11.25 -2.1,-10.75 -1,-10.75 ; -1,-7.25 -2.1,-7.25 -2.1,-6.75 -1,-6.75 ; -1,-3.25 -2.1,-3.25 -2.1,-2.75 -1,-2.75 ; -1,0.75 -2.1,0.75 -2.1,1.25 -1,1.25 ; -1,4.75 -2.1,4.75 -2.1,5.25 -1,5.25 ; -1,8.75 -2.1,8.75 -2.1,9.25 -1,9.25 ; -1,12.75 -2.1,12.75 -2.1,13.25 -1,13.25 ; -1,16.75 -2.1,16.75 -2.1,17.25 -1,17.25 ; -1,20.75 -2.1,20.75 -2.1,21.25 -1,21.25 ; -1,24.75 -2.1,24.75 -2.1,25.25 -1,25.25 ; -1,28.75 -2.1,28.75 -2.1,29.25 -1,29.25 ; 1,-29.25 2.1,-29.25 2.1,-28.75 1,-28.75 ; 1,-25.25 2.1,-25.25 2.1,-24.75 1,-24.75 ; 1,-21.25 2.1,-21.25 2.1,-20.75 1,-20.75 ; 1,-17.25 2.1,-17.25 2.1,-16.75 1,-16.75 ; 1,-13.25 2.1,-13.25 2.1,-12.75 1,-12.75 ; 1,-9.25 2.1,-9.25 2.1,-8.75 1,-8.75 ; 1,-5.25 2.1,-5.25 2.1,-4.75 1,-4.75 ; 1,-1.25 2.1,-1.25 2.1,-0.75 1,-0.75 ; 1,2.75 2.1,2.75 2.1,3.25 1,3.25 ; 1,6.75 2.1,6.75 2.1,7.25 1,7.25 ; 1,10.75 2.1,10.75 2.1,11.25 1,11.25 ; 1,14.75 2.1,14.75 2.1,15.25 1,15.25 ; 1,18.75 2.1,18.75 2.1,19.25 1,19.25 ; 1,22.75 2.1,22.75 2.1,23.25 1,23.25 ; 1,26.75 2.1,26.75 2.1,27.25 1,27.25 ; 1,30.75 2.1,30.75 2.1,31.25 1,31.25 ; 1,31.25 0.25,32 -1,32 -1,-32 1,-32 1,31.25
  text "'.Designator'" at 0.84,-4.047 h1

## PinHeader_1x33_P2.00mm_Horizontal [mm]
pads (33):
  rect 1.35x1.35 hole 0.8: 1(0,0)
  rrect100% 1.35x1.35 hole 0.8: 2(0,-2) 3(0,-4) 4(0,-6) 5(0,-8) 6(0,-10) 7(0,-12) 8(0,-14) 9(0,-16) 10(0,-18) 11(0,-20) 12(0,-22) 13(0,-24) 14(0,-26) 15(0,-28) 16(0,-30) 17(0,-32) 18(0,-34) 19(0,-36) 20(0,-38) 21(0,-40) 22(0,-42) 23(0,-44) 24(0,-46) 25(0,-48) 26(0,-50) 27(0,-52) 28(0,-54) 29(0,-56) 30(0,-58) 31(0,-60) 32(0,-62) 33(0,-64)
F.SilkS:
  drawing of 208 lines, arcs and shapes, not listed
F.CrtYd:
  lines w0.05: -1.5,-65.5 7.7,-65.5 7.7,1.5 -1.5,1.5 -1.5,-65.5
F.Fab:
  drawing of 203 lines, arcs and shapes, not listed
  text "'.Designator'" at 3.006,-35.642 h0.9

## PinHeader_1x33_P2.00mm_Vertical [mm]
pads (33):
  rect 1.35x1.35 hole 0.8: 1(0,0)
  rrect100% 1.35x1.35 hole 0.8: 2(0,-2) 3(0,-4) 4(0,-6) 5(0,-8) 6(0,-10) 7(0,-12) 8(0,-14) 9(0,-16) 10(0,-18) 11(0,-20) 12(0,-22) 13(0,-24) 14(0,-26) 15(0,-28) 16(0,-30) 17(0,-32) 18(0,-34) 19(0,-36) 20(0,-38) 21(0,-40) 22(0,-42) 23(0,-44) 24(0,-46) 25(0,-48) 26(0,-50) 27(0,-52) 28(0,-54) 29(0,-56) 30(0,-58) 31(0,-60) 32(0,-62) 33(0,-64)
F.SilkS:
  lines w0.12: -1.06,0 -1.06,1.06 0,1.06 ; -1.06,-65.06 -1.06,-1 1.06,-1 1.06,-65.06 -1.06,-65.06
F.CrtYd:
  lines w0.05: -1.5,-65.5 1.5,-65.5 1.5,1.5 -1.5,1.5 -1.5,-65.5
F.Fab:
  lines w0.1: -1,-65 -1,0.5 -0.5,1 1,1 1,-65 -1,-65
  text "'.Designator'" at 0.84,-36.047 h1